# Altium footprint library 6-Connectors-5.PcbLib: 46 footprints (part 3 of 5) (continued)
## HARTING_09 25 130 6921 [mm] "DIN 41612, Type 3C, Thru-Hole;  Rows a+b+c, 30 Positions, Performance level 2, Lead 3.0mm, Pitch 2.54mm, Right Angle Male Connector"
height 11
pads (32):
  round 1.7 hole 1: a1(0,0) a2(0,-2.54) a3(0,-5.08) a4(0,-7.62) a5(0,-10.16) a6(0,-12.7) a7(0,-15.24) a8(0,-17.78) a9(0,-20.32) a10(0,-22.86) b1(-2.54,0) b2(-2.54,-2.54) b3(-2.54,-5.08) b4(-2.54,-7.62) b5(-2.54,-10.16) b6(-2.54,-12.7) b7(-2.54,-15.24) b8(-2.54,-17.78) b9(-2.54,-20.32) b10(-2.54,-22.86) c1(-5.08,0) c2(-5.08,-2.54) c3(-5.08,-5.08) c4(-5.08,-7.62) c5(-5.08,-10.16) c6(-5.08,-12.7) c7(-5.08,-15.24) c8(-5.08,-17.78) c9(-5.08,-20.32) c10(-5.08,-22.86)
  round 3.5 / inner round 3.5 / far side round 5.1 hole 2.8: MTG1(2.54,5.08) MTG2(2.54,-27.94)
Top Overlay:
  lines w0.2: 2.04,-24.93 -0.31,-24.93 -0.31,-30.78 7.74,-30.78 7.74,-27.28 ; 2.04,2.07 -0.31,2.07 -0.31,7.92 7.74,7.92 7.74,4.32 ; 2.04,-25.14 3.897,-25.14 5.132,-27.28 12.64,-27.28 12.64,4.32 5.132,4.32 3.897,2.18 2.04,2.18 2.04,-25.14
  text "10" at -8.327,-23.435 h1.2
  text "5" at -7.304,-10.76 h1.2
  text "1" at -6.919,-0.725 h1.2
  text "b" at -2.94,1.48 h1.2
  text "c" at -5.465,1.48 h1.2
  text "a" at 2.785,-0.395 h1.2
Mechanical 8:
  lines w0.1: -5.58,-22.86 -5.08,-22.86 ; -5.08,-23.36 -5.08,-22.86 ; -5.08,-22.36 -5.08,-22.86 ; -4.58,-22.86 -5.08,-22.86 ; -3.04,-22.86 -2.54,-22.86 ; -2.54,-23.36 -2.54,-22.86 ; -2.54,-22.36 -2.54,-22.86 ; -2.04,-22.86 -2.54,-22.86 ; -0.5,-22.86 0,-22.86 ; -0.5,0 0,0 ; 0,-23.36 0,-22.86 ; 0,-22.36 0,-22.86 ; 0,-0.5 0,0 ; 0,0.5 0,0 ; 0.5,-22.86 0,-22.86 ; 0.5,0 0,0 ; 2.04,-27.94 2.54,-27.94 ; 2.04,5.08 2.54,5.08 ; 2.54,-28.44 2.54,-27.94 ; 2.54,-27.44 2.54,-27.94 ; 2.54,4.58 2.54,5.08 ; 2.54,5.58 2.54,5.08 ; 3.04,-27.94 2.54,-27.94 ; 3.04,5.08 2.54,5.08 ; -5.08,0 -5.58,0 -5.08,0 ; -5.08,0 -5.08,0.5 -5.08,0 ; -5.08,0 -4.58,0 -5.08,0 ; -5.08,0 -5.08,-0.5 -5.08,0 ; -2.54,0 -3.04,0 -2.54,0 ; -2.54,0 -2.54,0.5 -2.54,0 ; -2.54,0 -2.04,0 -2.54,0 ; -2.54,0 -2.54,-0.5 -2.54,0
Mechanical 14:
  lines w0.1: 2.04,-24.93 -0.31,-24.93 -0.31,-30.78 7.74,-30.78 7.74,-27.28 ; 2.04,-23.16 -5.08,-23.16 cw(c-5.08,-22.86) -5.08,-22.56 2.04,-22.562 ; 2.04,-20.62 -5.08,-20.62 cw(c-5.08,-20.32) -5.08,-20.02 2.04,-20.022 ; 2.04,-18.08 -5.08,-18.08 cw(c-5.08,-17.78) -5.08,-17.48 2.04,-17.482 ; 2.04,-15.54 -5.08,-15.54 cw(c-5.08,-15.24) -5.08,-14.94 2.04,-14.942 ; 2.04,-13 -5.08,-13 cw(c-5.08,-12.7) -5.08,-12.4 2.04,-12.402 ; 2.04,-10.46 -5.08,-10.46 cw(c-5.08,-10.16) -5.08,-9.86 2.04,-9.862 ; 2.04,-7.92 -5.08,-7.92 cw(c-5.08,-7.62) -5.08,-7.32 2.04,-7.322 ; 2.04,-5.38 -5.08,-5.38 cw(c-5.08,-5.08) -5.08,-4.78 2.04,-4.782 ; 2.04,-2.84 -5.08,-2.84 cw(c-5.08,-2.54) -5.08,-2.24 2.04,-2.242 ; 2.04,-0.3 -5.08,-0.3 cw(c-5.08,0) -5.08,0.3 2.04,0.298 ; 2.04,2.07 -0.31,2.07 -0.31,7.92 7.74,7.92 7.74,4.32 ; 2.04,-25.14 3.897,-25.14 5.132,-27.28 12.64,-27.28 12.64,4.32 5.132,4.32 3.897,2.18 2.04,2.18 2.04,-25.14
  text "10" at -8.327,-23.435 h1.2
  text "1" at -6.919,-0.725 h1.2
  text "5" at -7.304,-10.76 h1.2
  text "b" at -2.94,1.48 h1.2
  text "c" at -5.465,1.48 h1.2
3D body "v160-080.stp": height 0.02, standoff -1.65, extent -0.8,-23.66 0.8,-22.06
3D body "v160-080.stp": height 0.02, standoff -1.65, extent -3.34,-23.66 -1.74,-22.06
3D body "v160-080.stp": height 0.02, standoff -1.65, extent -5.88,-23.66 -4.28,-22.06
3D body "v160-080.stp": height 0.02, standoff -1.65, extent -0.8,-21.12 0.8,-19.52
3D body "v160-080.stp": height 0.02, standoff -1.65, extent -3.34,-21.12 -1.74,-19.52
3D body "v160-080.stp": height 0.02, standoff -1.65, extent -5.88,-21.12 -4.28,-19.52
3D body "v160-080.stp": height 0.02, standoff -1.65, extent -0.8,-18.58 0.8,-16.98
3D body "v160-080.stp": height 0.02, standoff -1.65, extent -3.34,-18.58 -1.74,-16.98
3D body "v160-080.stp": height 0.02, standoff -1.65, extent -5.88,-18.58 -4.28,-16.98
3D body "v160-080.stp": height 0.02, standoff -1.65, extent -0.8,-16.04 0.8,-14.44
3D body "v160-080.stp": height 0.02, standoff -1.65, extent -3.34,-16.04 -1.74,-14.44
3D body "v160-080.stp": height 0.02, standoff -1.65, extent -5.88,-16.04 -4.28,-14.44
3D body "v160-080.stp": height 0.02, standoff -1.65, extent -0.8,-13.5 0.8,-11.9
3D body "v160-080.stp": height 0.02, standoff -1.65, extent -3.34,-13.5 -1.74,-11.9
3D body "v160-080.stp": height 0.02, standoff -1.65, extent -5.88,-13.5 -4.28,-11.9
3D body "v160-080.stp": height 0.02, standoff -1.65, extent -0.8,-10.96 0.8,-9.36
3D body "v160-080.stp": height 0.02, standoff -1.65, extent -3.34,-10.96 -1.74,-9.36
3D body "v160-080.stp": height 0.02, standoff -1.65, extent -5.88,-10.96 -4.28,-9.36
3D body "v160-080.stp": height 0.02, standoff -1.65, extent -0.8,-8.42 0.8,-6.82
3D body "v160-080.stp": height 0.02, standoff -1.65, extent -3.34,-8.42 -1.74,-6.82
3D body "v160-080.stp": height 0.02, standoff -1.65, extent -5.88,-8.42 -4.28,-6.82
3D body "v160-080.stp": height 0.02, standoff -1.65, extent -0.8,-5.88 0.8,-4.28
3D body "v160-080.stp": height 0.02, standoff -1.65, extent -3.34,-5.88 -1.74,-4.28
3D body "v160-080.stp": height 0.02, standoff -1.65, extent -5.88,-5.88 -4.28,-4.28
3D body "v160-080.stp": height 0.02, standoff -1.65, extent -0.8,-3.34 0.8,-1.74
3D body "v160-080.stp": height 0.02, standoff -1.65, extent -3.34,-3.34 -1.74,-1.74
3D body "v160-080.stp": height 0.02, standoff -1.65, extent -5.88,-3.34 -4.28,-1.74
3D body "v160-080.stp": height 0.02, standoff -1.65, extent -0.8,-0.8 0.8,0.8
3D body "v160-080.stp": height 0.02, standoff -1.65, extent -3.34,-0.8 -1.74,0.8
3D body "v160-080.stp": height 0.02, standoff -1.65, extent -5.88,-0.8 -4.28,0.8
3D body "HARTING_09 25 130 6921.stp": height 9.35, standoff -3, extent -5.38,-30.78 12.64,7.92

## HARTING_09 73 296 6801 [mm] "Connector; DIN 41612, Type R, Thru-Hole; Rows a+b+c, 96 Position; Right Angle"
height 9.5
pads (98):
  round 1.7 hole 1: a1(0,0) a2(0,-2.54) a3(0,-5.08) a4(0,-7.62) a5(0,-10.16) a6(0,-12.7) a7(0,-15.24) a8(0,-17.78) a9(0,-20.32) a10(0,-22.86) a11(0,-25.4) a12(0,-27.94) a13(0,-30.48) a14(0,-33.02) a15(0,-35.56) a16(0,-38.1) a17(0,-40.64) a18(0,-43.18) a19(0,-45.72) a20(0,-48.26) a21(0,-50.8) a22(0,-53.34) a23(0,-55.88) a24(0,-58.42) a25(0,-60.96) a26(0,-63.5) a27(0,-66.04) a28(0,-68.58) a29(0,-71.12) a30(0,-73.66) a31(0,-76.2) a32(0,-78.74) b1(-2.54,0) b2(-2.54,-2.54) b3(-2.54,-5.08) b4(-2.54,-7.62) b5(-2.54,-10.16) b6(-2.54,-12.7) b7(-2.54,-15.24) b8(-2.54,-17.78) b9(-2.54,-20.32) b10(-2.54,-22.86) b11(-2.54,-25.4) b12(-2.54,-27.94) b13(-2.54,-30.48) b14(-2.54,-33.02) b15(-2.54,-35.56) b16(-2.54,-38.1) b17(-2.54,-40.64) b18(-2.54,-43.18) b19(-2.54,-45.72) b20(-2.54,-48.26) b21(-2.54,-50.8) b22(-2.54,-53.34) b23(-2.54,-55.88) b24(-2.54,-58.42) b25(-2.54,-60.96) b26(-2.54,-63.5) b27(-2.54,-66.04) b28(-2.54,-68.58) b29(-2.54,-71.12) b30(-2.54,-73.66) b31(-2.54,-76.2) b32(-2.54,-78.74) c1(-5.08,0) c2(-5.08,-2.54) c3(-5.08,-5.08) c4(-5.08,-7.62) c5(-5.08,-10.16) c6(-5.08,-12.7) c7(-5.08,-15.24) c8(-5.08,-17.78) c9(-5.08,-20.32) c10(-5.08,-22.86) c11(-5.08,-25.4) c12(-5.08,-27.94) c13(-5.08,-30.48) c14(-5.08,-33.02) c15(-5.08,-35.56) c16(-5.08,-38.1) c17(-5.08,-40.64) c18(-5.08,-43.18) c19(-5.08,-45.72) c20(-5.08,-48.26) c21(-5.08,-50.8) c22(-5.08,-53.34) c23(-5.08,-55.88) c24(-5.08,-58.42) c25(-5.08,-60.96) c26(-5.08,-63.5) c27(-5.08,-66.04) c28(-5.08,-68.58) c29(-5.08,-71.12) c30(-5.08,-73.66) c31(-5.08,-76.2) c32(-5.08,-78.74)
  round 3.5 / inner round 3.5 / far side round 5.1 hole 2.8: MTG1(2.54,5.08) MTG2(2.54,-83.82)
Top Overlay:
  lines w0.2: 1.738,-86.32 0.01,-86.32 0.01,-81.395 1.14,-81.395 1.14,2.655 0.01,2.655 0.01,7.58 1.738,7.58 ; 3.556,-86.32 6.14,-86.32 6.14,-84.003 6.14,5.263 6.14,7.58 3.556,7.58 ; 6.14,-81.845 12.06,-81.845 ; 6.14,-80.795 6.77,-80.795 12.06,-80.795 ; 6.14,2.055 6.77,2.055 12.06,2.055 ; 6.14,3.105 12.06,3.105 ; 12.06,-81.845 12.06,-80.795 ; 12.06,-81.845 12.69,-81.215 12.69,-80.165 ; 12.06,-80.795 12.06,2.055 ; 12.06,-80.795 12.69,-80.165 ; 12.06,2.055 12.06,3.105 ; 12.06,2.055 12.69,1.425 ; 12.06,3.105 12.69,2.475 12.69,1.425 ; 12.69,-80.165 12.69,1.425
  text "5" at -6.895,-10.785 h1.2
  text "1" at -6.695,-0.725 h1.2
  text "30" at -8.12,-74.235 h1.2
  text "10" at -8.02,-23.535 h1.2
  text "32" at -8.12,-79.315 h1.2
  text "25" at -8.1,-61.6 h1.2
  text "c" at -4.58,2.04 h1.2
  text "b" at -2.04,2.04 h1.2
  text "a" at -0.6,2.04 h1.2
  text "15" at -8.02,-36.235 h1.2
  text "20" at -8.12,-48.835 h1.2
Mechanical 8:
  lines w0.1: -5.08,-39.37 12.64,-39.37 ; 5.3,-86.3 5.3,7.5
Mechanical 14:
  circle w0.1: c2.54,5.08 r1.4
  circle w0.1: c2.54,-83.82 r1.4
  lines w0.1: 1.14,-77.97 5.59,-77.97 ; 1.14,-76.97 5.59,-76.97 ; 1.14,-52.57 5.59,-52.57 ; 1.14,-51.57 5.59,-51.57 ; 1.14,-27.17 5.59,-27.17 ; 1.14,-26.17 5.59,-26.17 ; 1.14,-1.77 5.59,-1.77 ; 1.14,-0.77 5.59,-0.77 ; 1.297,5.08 2.54,5.08 ; 6.14,-81.845 12.06,-81.845 ; 6.14,-80.795 6.77,-80.795 ; 6.14,2.055 6.77,2.055 ; 6.14,3.105 12.06,3.105 ; 1.14,-81.395 0.01,-81.395 0.01,-86.32 6.14,-86.32 6.14,-84.003 ; 1.14,-81.395 4.084,-81.395 5.59,-84.003 ; 1.14,-81.395 1.14,2.655 ; 1.14,2.655 0.01,2.655 0.01,7.58 6.14,7.58 6.14,5.263 ; 1.14,2.655 4.084,2.655 5.59,5.263 ; 5.59,-84.003 6.14,-84.003 ; 5.59,-84.003 5.59,-77.72 1.69,-77.72 1.69,-77.22 5.59,-77.22 5.59,-52.32 1.69,-52.32 1.69,-51.82 5.59,-51.82 5.59,-26.92 1.69,-26.92 1.69,-26.42 5.59,-26.42 5.59,-1.52 1.69,-1.52 1.69,-1.02 5.59,-1.02 5.59,5.263 ; 5.59,5.263 6.14,5.263 ; 6.14,-84.003 6.14,5.263 ; 6.77,-80.795 6.77,2.055 ; 6.77,-80.795 12.06,-80.795 ; 6.77,2.055 12.06,2.055 ; 12.06,-81.845 12.06,-80.795 ; 12.06,-81.845 12.69,-81.215 12.69,-80.165 ; 12.06,-80.795 12.06,2.055 ; 12.06,-80.795 12.69,-80.165 ; 12.06,2.055 12.06,3.105 ; 12.06,2.055 12.69,1.425 ; 12.06,3.105 12.69,2.475 12.69,1.425 ; 12.69,-80.165 12.69,1.425
  text "5" at -6.895,-10.785 h1.2
  text "10" at -8.02,-23.535 h1.2
  text "25" at -8.1,-61.6 h1.2
  text "1" at -6.695,-0.725 h1.2
  text "32" at -8.12,-79.315 h1.2
  text "15" at -8.02,-36.235 h1.2
  text "20" at -8.12,-48.835 h1.2
  text "30" at -8.12,-74.235 h1.2
  text "c" at -4.58,2.04 h1.2
  text "b" at -2.04,2.04 h1.2
  text "a" at -0.6,2.04 h1.2
3D body "HARTING_09 73 296 6801.stp": height 9.1, standoff -3, extent -5.38,-86.37 12.74,7.63

## HARTING_09 79 196 6903 [mm] "DIN 41612, Type RL, 96 Position, Rows a+b+c, Performance level 2, Straight Male Connector, Lead 4.0 mm, Pitch 2.54mm"
height 11.6
pads (98):
  round 1.7 hole 1: a1(0,0) a2(0,-2.54) a3(0,-5.08) a4(0,-7.62) a5(0,-10.16) a6(0,-12.7) a7(0,-15.24) a8(0,-17.78) a9(0,-20.32) a10(0,-22.86) a11(0,-25.4) a12(0,-27.94) a13(0,-30.48) a14(0,-33.02) a15(0,-35.56) a16(0,-38.1) a17(0,-40.64) a18(0,-43.18) a19(0,-45.72) a20(0,-48.26) a21(0,-50.8) a22(0,-53.34) a23(0,-55.88) a24(0,-58.42) a25(0,-60.96) a26(0,-63.5) a27(0,-66.04) a28(0,-68.58) a29(0,-71.12) a30(0,-73.66) a31(0,-76.2) a32(0,-78.74) b1(2.54,0) b2(2.54,-2.54) b3(2.54,-5.08) b4(2.54,-7.62) b5(2.54,-10.16) b6(2.54,-12.7) b7(2.54,-15.24) b8(2.54,-17.78) b9(2.54,-20.32) b10(2.54,-22.86) b11(2.54,-25.4) b12(2.54,-27.94) b13(2.54,-30.48) b14(2.54,-33.02) b15(2.54,-35.56) b16(2.54,-38.1) b17(2.54,-40.64) b18(2.54,-43.18) b19(2.54,-45.72) b20(2.54,-48.26) b21(2.54,-50.8) b22(2.54,-53.34) b23(2.54,-55.88) b24(2.54,-58.42) b25(2.54,-60.96) b26(2.54,-63.5) b27(2.54,-66.04) b28(2.54,-68.58) b29(2.54,-71.12) b30(2.54,-73.66) b31(2.54,-76.2) b32(2.54,-78.74) c1(5.08,0) c2(5.08,-2.54) c3(5.08,-5.08) c4(5.08,-7.62) c5(5.08,-10.16) c6(5.08,-12.7) c7(5.08,-15.24) c8(5.08,-17.78) c9(5.08,-20.32) c10(5.08,-22.86) c11(5.08,-25.4) c12(5.08,-27.94) c13(5.08,-30.48) c14(5.08,-33.02) c15(5.08,-35.56) c16(5.08,-38.1) c17(5.08,-40.64) c18(5.08,-43.18) c19(5.08,-45.72) c20(5.08,-48.26) c21(5.08,-50.8) c22(5.08,-53.34) c23(5.08,-55.88) c24(5.08,-58.42) c25(5.08,-60.96) c26(5.08,-63.5) c27(5.08,-66.04) c28(5.08,-68.58) c29(5.08,-71.12) c30(5.08,-73.66) c31(5.08,-76.2) c32(5.08,-78.74)
  round 3.5 / inner round 3.5 / far side round 5.1 hole 2.8: MTG1(1.81,5.63) MTG2(1.81,-84.37)
Top Overlay:
  lines w0.2: -1.835,-83.32 -1.835,-86.87 0.152,-86.87 ; -1.835,4.58 -1.835,8.13 0.152,8.13 ; -1.36,-79.484 -1.36,-81.47 ; -1.36,0.744 -1.36,2.83 ; -1,-83.32 -3.01,-83.32 -3.01,4.58 -1,4.58 ; -0.89,-86.87 -0.89,-85.678 ; -0.89,-83.062 -0.89,-81.92 ; -0.89,-82.57 -2.46,-82.57 ; -0.89,3.28 -0.89,4.322 ; -0.89,3.93 -2.46,3.93 ; -0.89,6.938 -0.89,8.13 ; -0.055,3.28 -1.81,3.28 -1.81,-81.92 0.079,-81.92 ; 0.733,2.83 -1.36,2.83 ; 1.042,-81.47 -1.36,-81.47 ; 2.578,-81.47 4.06,-81.47 ; 2.887,2.83 4.06,2.83 ; 3.468,-86.87 6.915,-86.87 6.915,-83.32 ; 3.468,8.13 6.915,8.13 6.915,4.58 ; 3.541,-81.92 4.51,-81.92 4.06,-81.47 ; 3.675,3.28 4.51,3.28 4.06,2.83 ; 4.51,-86.87 4.51,-85.678 ; 4.51,-83.062 4.51,-80.97 ; 4.51,-81.62 7.54,-81.62 ; 4.51,2.98 7.54,2.98 ; 4.51,4.322 4.51,2.33 ; 4.51,6.938 4.51,8.13 ; 4.62,-83.32 8.09,-83.32 8.09,4.58 4.62,4.58 ; 6.44,-79.484 6.44,-80.52 ; 6.44,0.744 6.44,1.88 ; -2.46,-82.57 -2.46,3.93 ; -2.46,-82.57 -1.36,-81.47 ; -2.46,3.93 -1.36,2.83 ; 4.06,-81.47 4.06,-80.52 ; 4.06,-80.52 6.44,-80.52 ; 4.06,-80.52 4.51,-80.97 ; 4.06,1.88 4.06,2.83 ; 4.06,1.88 6.44,1.88 ; 4.06,1.88 4.51,2.33 ; 4.51,-80.97 6.89,-80.97 6.89,2.33 4.51,2.33 ; 6.44,-80.52 7.54,-81.62 ; 6.44,1.88 7.54,2.98 ; 7.54,-81.62 7.54,2.98
  text "1" at -4.127,-0.6 h1.2
  text "5" at -4.763,-10.76 h1.2
  text "a" at -0.318,1.587 h1.2
  text "b" at 1.27,1.587 h1.2
  text "c" at 2.857,1.587 h1.2
  text "10" at -5.715,-23.46 h1.2
  text "15" at -5.715,-36.16 h1.2
  text "20" at -5.715,-48.86 h1.2
  text "25" at -5.715,-61.56 h1.2
  text "30" at -5.715,-74.26 h1.2
  text "32" at -5.715,-79.34 h1.2
Mechanical 8:
  drawing of 400 lines, arcs and shapes, not listed
Mechanical 14:
  circle w0.1: c1.81,5.63 r1.4
  circle w0.1: c1.81,-84.37 r1.4
  lines w0.1: -1.835,-83.32 -1.835,-86.87 6.915,-86.87 6.915,-83.32 ; -1.835,4.58 -1.835,8.13 6.915,8.13 6.915,4.58 ; -0.89,-86.87 -0.89,-81.92 ; -0.89,-83.32 -3.01,-83.32 -3.01,4.58 -0.89,4.58 ; -0.89,-82.82 0.288,-82.82 cw(c1.81,-84.74) 3.332,-82.82 4.51,-82.82 ; -0.89,-82.57 -2.46,-82.57 ; -0.89,3.28 -0.89,8.13 ; -0.89,3.93 -2.46,3.93 ; -0.89,4.08 0.288,4.08 ccw(c1.81,6) 3.332,4.08 4.51,4.08 ; 4.51,-86.87 4.51,-80.97 ; 4.51,-83.32 8.09,-83.32 8.09,4.58 4.51,4.58 ; 4.51,-81.62 7.54,-81.62 ; 4.51,2.98 7.54,2.98 ; 4.51,8.13 4.51,2.33 ; -2.46,-82.57 -2.46,3.93 ; -2.46,-82.57 -1.36,-81.47 ; -2.46,3.93 -1.36,2.83 ; -1.36,-81.47 4.06,-81.47 ; -1.36,-81.47 -1.36,2.83 ; -1.36,2.83 4.06,2.83 ; 4.06,-81.47 4.06,-80.52 ; 4.06,-81.47 4.51,-81.92 -1.81,-81.92 -1.81,3.28 4.51,3.28 4.06,2.83 ; 4.06,-80.52 6.44,-80.52 ; 4.06,-80.52 4.51,-80.97 ; 4.06,1.88 4.06,2.83 ; 4.06,1.88 6.44,1.88 ; 4.06,1.88 4.51,2.33 ; 4.51,-80.97 6.89,-80.97 6.89,2.33 4.51,2.33 ; 6.44,-80.52 6.44,1.88 ; 6.44,-80.52 7.54,-81.62 ; 6.44,1.88 7.54,2.98 ; 7.54,-81.62 7.54,2.98
  text "32" at -5.715,-79.34 h1.2
  text "30" at -5.715,-74.26 h1.2
  text "25" at -5.715,-61.56 h1.2
  text "20" at -5.715,-48.86 h1.2
  text "15" at -5.715,-36.16 h1.2
  text "10" at -5.715,-23.46 h1.2
  text "c" at 2.857,1.587 h1.2
  text "b" at 1.27,1.587 h1.2
  text "a" at -0.318,1.587 h1.2
  text "5" at -4.763,-10.76 h1.2
  text "1" at -4.127,-0.6 h1.2
3D body "HARTING_09 79 196 6903.stp": height 11.6, standoff -2.5, extent -3.01,-86.87 8.09,8.13

## HARTING_60 01 068 5232 [mm] "68 Positions, Pitch 1.27mm, Right Angle HAR-MIK Male Connector, Panel Fixing M2.5 / PCB Fixing M2.5"
height 9.5
pads (70):
  round 1.5 hole 0.8: 1(-20.955,3.81) 2(-19.685,1.905) 3(-18.415,3.81) 4(-17.145,1.905) 5(-15.875,3.81) 6(-14.605,1.905) 7(-13.335,3.81) 8(-12.065,1.905) 9(-10.795,3.81) 10(-9.525,1.905) 11(-8.255,3.81) 12(-6.985,1.905) 13(-5.715,3.81) 14(-4.445,1.905) 15(-3.175,3.81) 16(-1.905,1.905) 17(-0.635,3.81) 18(0.635,1.905) 19(1.905,3.81) 20(3.175,1.905) 21(4.445,3.81) 22(5.715,1.905) 23(6.985,3.81) 24(8.255,1.905) 25(9.525,3.81) 26(10.795,1.905) 27(12.065,3.81) 28(13.335,1.905) 29(14.605,3.81) 30(15.875,1.905) 31(17.145,3.81) 32(18.415,1.905) 33(19.685,3.81) 34(20.955,1.905) 35(-20.955,0) 36(-19.685,-1.905) 37(-18.415,0) 38(-17.145,-1.905) 39(-15.875,0) 40(-14.605,-1.905) 41(-13.335,0) 42(-12.065,-1.905) 43(-10.795,0) 44(-9.525,-1.905) 45(-8.255,0) 46(-6.985,-1.905) 47(-5.715,0) 48(-4.445,-1.905) 49(-3.175,0) 50(-1.905,-1.905) 51(-0.635,0) 52(0.635,-1.905) 53(1.905,0) 54(3.175,-1.905) 55(4.445,0) 56(5.715,-1.905) 57(6.985,0) 58(8.255,-1.905) 59(9.525,0) 60(10.795,-1.905) 61(12.065,0) 62(13.335,-1.905) 63(14.605,0) 64(15.875,-1.905) 65(17.145,0) 66(18.415,-1.905) 67(19.685,0) 68(20.955,-1.905)
  round 5 hole 2.8: 69(-28.94,0) 70(28.94,0)
Top Overlay:
  lines w0.2: -31.94,-5.904 -19.941,-5.904 -19.941,-6.604 ; -31.94,-3.805 -26.515,-3.805 -26.515,-1.6 ; -26.506,1.65 -26.506,5.194 ; -26.116,-6.604 -26.115,-10.504 -26.915,-10.504 -26.915,-10.804 -26.04,-12.104 26.04,-12.104 26.915,-10.804 26.915,-10.504 26.115,-10.504 26.115,-6.604 ; -25.116,5.194 -24.716,-3.005 24.715,-3.005 25.115,5.194 ; -19.841,-3.005 -19.841,-3.805 -9.317,-3.805 -9.317,-3.005 ; -9.217,-6.604 -9.217,-5.904 9.217,-5.904 9.217,-6.604 ; 9.317,-3.005 9.317,-3.805 19.841,-3.805 19.841,-3.005 ; 19.941,-6.604 19.941,-5.904 31.94,-5.904 ; 26.515,-1.6 26.515,-3.805 31.94,-3.805 ; 26.525,1.65 26.525,5.194 ; -31.94,-6.604 31.94,-6.604 31.94,5.194 -31.94,5.194 -31.94,-6.604
  text "35" at -23.875,-0.523 h1
  text "2" at -23.45,1.477 h1
  text "1" at -23.3,3.35 h1
  text "36" at -23.825,-2.35 h1
  text "33" at 22.1,3.4 h1
  text "68" at 22.15,-2.425 h1
  text "67" at 22.125,-0.425 h1
  text "34" at 22.15,1.425 h1
Mechanical 8:
  drawing of 280 lines, arcs and shapes, not listed
Mechanical 14:
  circle w0.1: c28.94,0 r1.006
  circle w0.1: c-28.94,0 r1.006
  lines w0.1: -31.94,-5.904 -19.941,-5.904 -19.941,-6.604 ; -31.94,-3.805 -26.515,-3.805 -26.515,5.194 ; -26.116,-6.604 -26.115,-10.504 -26.915,-10.504 -26.915,-10.804 -26.04,-12.104 26.04,-12.104 26.915,-10.804 26.915,-10.504 26.115,-10.504 26.115,-6.604 ; -25.116,5.194 -24.716,-3.005 24.715,-3.005 25.115,5.194 ; -21.156,-3.005 -21.156,4.12 -20.756,4.12 -20.756,-3.005 ; -19.886,-3.005 -19.886,2.22 -19.486,2.22 -19.486,-3.005 ; -19.841,-3.005 -19.841,-3.805 -9.317,-3.805 -9.317,-3.005 ; -18.616,-3.005 -18.616,4.12 -18.216,4.12 -18.216,-3.005 ; -17.346,-3.005 -17.346,2.22 -16.946,2.22 -16.946,-3.005 ; -16.076,-3.005 -16.076,4.12 -15.676,4.12 -15.676,-3.005 ; -14.807,-3.005 -14.807,2.22 -14.407,2.22 -14.407,-3.005 ; -13.537,-3.005 -13.537,4.12 -13.137,4.12 -13.137,-3.005 ; -12.267,-3.005 -12.267,2.22 -11.867,2.22 -11.867,-3.005 ; -10.997,-3.005 -10.997,4.12 -10.597,4.12 -10.597,-3.005 ; -9.727,-3.005 -9.727,2.22 -9.327,2.22 -9.327,-3.005 ; -9.217,-6.604 -9.217,-5.904 9.217,-5.904 9.217,-6.604 ; -8.457,-3.005 -8.457,4.12 -8.057,4.12 -8.057,-3.005 ; -7.187,-3.005 -7.187,2.22 -6.787,2.22 -6.787,-3.005 ; -5.917,-3.005 -5.917,4.12 -5.517,4.12 -5.517,-3.005 ; -4.647,-3.005 -4.647,2.22 -4.247,2.22 -4.247,-3.005 ; -3.378,-3.005 -3.378,4.12 -2.978,4.12 -2.978,-3.005 ; -2.108,-3.005 -2.108,2.22 -1.708,2.22 -1.708,-3.005 ; -0.838,-3.005 -0.838,4.12 -0.438,4.12 -0.438,-3.005 ; 0.432,-3.005 0.432,2.22 0.832,2.22 0.832,-3.005 ; 1.702,-3.005 1.702,4.12 2.102,4.12 2.102,-3.005 ; 2.972,-3.005 2.972,2.22 3.372,2.22 3.372,-3.005 ; 4.242,-3.005 4.242,4.12 4.642,4.12 4.642,-3.005 ; 5.512,-3.005 5.512,2.22 5.911,2.22 5.911,-3.005 ; 6.781,-3.005 6.781,4.12 7.181,4.12 7.181,-3.005 ; 8.051,-3.005 8.051,2.22 8.451,2.22 8.451,-3.005 ; 9.317,-3.005 9.317,-3.805 19.841,-3.805 19.841,-3.005 ; 9.321,-3.005 9.321,4.12 9.721,4.12 9.721,-3.005 ; 10.591,-3.005 10.591,2.22 10.991,2.22 10.991,-3.005 ; 11.861,-3.005 11.861,4.12 12.261,4.12 12.261,-3.005 ; 13.131,-3.005 13.131,2.22 13.531,2.22 13.531,-3.005 ; 14.401,-3.005 14.401,4.12 14.801,4.12 14.801,-3.005 ; 15.671,-3.005 15.671,2.22 16.071,2.22 16.071,-3.005 ; 16.941,-3.005 16.941,4.12 17.34,4.12 17.34,-3.005 ; 18.21,-3.005 18.21,2.22 18.61,2.22 18.61,-3.005 ; 19.48,-3.005 19.48,4.12 19.88,4.12 19.88,-3.005 ; 19.941,-6.604 19.941,-5.904 31.94,-5.904 ; 20.75,-3.005 20.75,2.22 21.15,2.22 21.15,-3.005 ; 26.515,5.194 26.515,-3.805 31.94,-3.805 ; -31.94,-6.604 31.94,-6.604 31.94,5.194 -31.94,5.194 -31.94,-6.604
  text "35" at -23.45,-0.523 h1.02
  text "2" at -23.45,1.477 h1.02
  text "1" at -23.45,3.327 h1.02
  text "36" at -23.45,-2.273 h1.02
  text "34" at 22.15,1.425 h1
  text "67" at 22.125,-0.425 h1
  text "68" at 22.15,-2.425 h1
  text "33" at 22.1,3.4 h1
3D body "HARTING_60 01 068 5232.stp": height 9.5, standoff -3.4, extent -31.94,-12.105 31.94,5.195

## HIROSE_FX2-40P-1.27DSL(71) [mm] "40 Contacts, 1.27mm Pitch, Right Angle Board to Board & Mezzanine Header with Prefixed Pin"
height 7.5
pads (42):
  round 1.5 hole 0.8: a1(-12.065,-0.953) a2(-10.795,-2.858) a3(-9.525,-0.953) a4(-8.255,-2.858) a5(-6.985,-0.953) a6(-5.715,-2.858) a7(-4.445,-0.953) a8(-3.175,-2.858) a9(-1.905,-0.953) a10(-0.635,-2.858) a11(0.635,-0.953) a12(1.905,-2.858) a13(3.175,-0.953) a14(4.445,-2.858) a15(5.715,-0.953) a16(6.985,-2.858) a17(8.255,-0.953) a18(9.525,-2.858) a19(10.795,-0.953) a20(12.065,-2.858) b1(-12.065,2.858) b2(-10.795,0.953) b3(-9.525,2.858) b4(-8.255,0.953) b5(-6.985,2.858) b6(-5.715,0.953) b7(-4.445,2.858) b8(-3.175,0.953) b9(-1.905,2.858) b10(-0.635,0.953) b11(0.635,2.858) b12(1.905,0.953) b13(3.175,2.858) b14(4.445,0.953) b15(5.715,2.858) b16(6.985,0.953) b17(8.255,2.858) b18(9.525,0.953) b19(10.795,2.858) b20(12.065,0.953)
  round 3 hole 2.3: MECH1(-15.375,0.953) MECH2(15.375,0.953)
Top Overlay:
  circle w0.3: c-12.1,-4.3 r0.15
  lines w0.2: -17.725,-0.243 -17.375,-0.243 -15.375,-1.398 -13.375,-0.243 -13.025,-0.243 ; -17.725,2.148 -17.375,2.148 -15.375,3.303 -13.375,2.148 -13.025,2.148 ; -13.025,-3.643 -13.025,-1.586 ; -13.025,-0.319 -13.025,2.224 ; -11.635,-3.643 -17.725,-3.643 -17.725,11.358 17.725,11.358 17.725,-3.643 12.905,-3.643 ; 11.944,3.858 13.025,3.858 13.025,1.586 ; 13.025,-3.643 13.025,-3.491 ; 13.025,-2.224 13.025,0.319 ; 13.025,-0.243 13.375,-0.243 15.375,-1.398 17.375,-0.243 17.725,-0.243 ; 13.025,2.148 13.375,2.148 15.375,3.303 17.375,2.148 17.725,2.148 ; -17.725,3.558 -12.977,3.558 -17.725,3.558 ; 13.025,3.558 17.725,3.558 13.025,3.558
  text "a1" at -14.787,-2.66 h1
  text "a20" at 13.588,-3.085 h1
  text "b1" at -12.647,4.742 h1
  text "b19" at 10.213,4.742 h1
Mechanical 8:
  drawing of 172 lines, arcs and shapes, not listed
Mechanical 14:
  circle w0.3: c-13.6,-1.1 r0.15
  lines w0.1: -17.725,-0.243 -17.375,-0.243 -15.375,-1.398 -13.375,-0.243 -13.025,-0.243 ; -17.725,2.148 -17.375,2.148 -15.375,3.303 -13.375,2.148 -13.025,2.148 ; -13.025,-3.643 -13.025,3.858 13.025,3.858 13.025,-3.643 ; -12.34,3.858 -12.34,-1.102 -11.79,-1.102 -11.79,3.858 ; -11.07,3.858 -11.07,-3.008 -10.52,-3.008 -10.52,3.858 ; -9.8,3.858 -9.8,-1.102 -9.25,-1.102 -9.25,3.858 ; -8.53,3.858 -8.53,-3.008 -7.98,-3.008 -7.98,3.858 ; -7.26,3.858 -7.26,-1.102 -6.71,-1.102 -6.71,3.858 ; -5.99,3.858 -5.99,-3.008 -5.44,-3.008 -5.44,3.858 ; -4.72,3.858 -4.72,-1.102 -4.17,-1.102 -4.17,3.858 ; -3.45,3.858 -3.45,-3.008 -2.9,-3.008 -2.9,3.858 ; -2.18,3.858 -2.18,-1.102 -1.63,-1.102 -1.63,3.858 ; -0.91,3.858 -0.91,-3.008 -0.36,-3.008 -0.36,3.858 ; 0.36,3.858 0.36,-1.102 0.91,-1.102 0.91,3.858 ; 1.63,3.858 1.63,-3.008 2.18,-3.008 2.18,3.858 ; 2.9,3.858 2.9,-1.102 3.45,-1.102 3.45,3.858 ; 4.17,3.858 4.17,-3.008 4.72,-3.008 4.72,3.858 ; 5.44,3.858 5.44,-1.102 5.99,-1.102 5.99,3.858 ; 6.71,3.858 6.71,-3.008 7.26,-3.008 7.26,3.858 ; 7.98,3.858 7.98,-1.102 8.53,-1.102 8.53,3.858 ; 9.25,3.858 9.25,-3.008 9.8,-3.008 9.8,3.858 ; 10.52,3.858 10.52,-1.102 11.07,-1.102 11.07,3.858 ; 11.79,3.858 11.79,-3.008 12.34,-3.008 12.34,3.858 ; 13.025,-0.243 13.375,-0.243 15.375,-1.398 17.375,-0.243 17.725,-0.243 ; 13.025,2.148 13.375,2.148 15.375,3.303 17.375,2.148 17.725,2.148 ; -17.725,-3.643 -17.725,11.358 17.725,11.358 17.725,-3.643 -17.725,-3.643 ; -17.725,3.558 -13.025,3.558 -17.725,3.558 ; -15.625,-1.048 -15.125,-1.048 -15.125,2.953 -15.625,2.953 -15.625,-1.048 ; 13.025,3.558 17.725,3.558 13.025,3.558 ; 15.125,-1.048 15.625,-1.048 15.625,2.953 15.125,2.953 15.125,-1.048
  text "a1" at -14.787,-2.66 h1
  text "a20" at 13.588,-3.085 h1
  text "b1" at -12.647,4.742 h1
  text "b19" at 10.213,4.742 h1
3D body "HIROSE_FX2-40P-1.27DSL(71).stp": height 7.5, standoff -3.3, extent -17.725,-3.642 17.725,11.358

## HIROSE_FX2-80P-1.27DSL(71) [mm] "80 Contacts, 1.27mm Pitch, Right Angle Board to Board & Mezzanine Header with Prefixed Pin"
height 7.5
pads (82):
  round 1.5 hole 0.8: a1(-24.765,-0.953) a2(-23.495,-2.858) a3(-22.225,-0.953) a4(-20.955,-2.858) a5(-19.685,-0.953) a6(-18.415,-2.858) a7(-17.145,-0.953) a8(-15.875,-2.858) a9(-14.605,-0.953) a10(-13.335,-2.858) a11(-12.065,-0.953) a12(-10.795,-2.858) a13(-9.525,-0.953) a14(-8.255,-2.858) a15(-6.985,-0.953) a16(-5.715,-2.858) a17(-4.445,-0.953) a18(-3.175,-2.858) a19(-1.905,-0.953) a20(-0.635,-2.858) a21(0.635,-0.953) a22(1.905,-2.858) a23(3.175,-0.953) a24(4.445,-2.858) a25(5.715,-0.953) a26(6.985,-2.858) a27(8.255,-0.953) a28(9.525,-2.858) a29(10.795,-0.953) a30(12.065,-2.858) a31(13.335,-0.953) a32(14.605,-2.858) a33(15.875,-0.953) a34(17.145,-2.858) a35(18.415,-0.953) a36(19.685,-2.858) a37(20.955,-0.953) a38(22.225,-2.858) a39(23.495,-0.953) a40(24.765,-2.858) b1(-24.765,2.858) b2(-23.495,0.953) b3(-22.225,2.858) b4(-20.955,0.953) b5(-19.685,2.858) b6(-18.415,0.953) b7(-17.145,2.858) b8(-15.875,0.953) b9(-14.605,2.858) b10(-13.335,0.953) b11(-12.065,2.858) b12(-10.795,0.953) b13(-9.525,2.858) b14(-8.255,0.953) b15(-6.985,2.858) b16(-5.715,0.953) b17(-4.445,2.858) b18(-3.175,0.953) b19(-1.905,2.858) b20(-0.635,0.953) b21(0.635,2.858) b22(1.905,0.953) b23(3.175,2.858) b24(4.445,0.953) b25(5.715,2.858) b26(6.985,0.953) b27(8.255,2.858) b28(9.525,0.953) b29(10.795,2.858) b30(12.065,0.953) b31(13.335,2.858) b32(14.605,0.953) b33(15.875,2.858) b34(17.145,0.953) b35(18.415,2.858) b36(19.685,0.953) b37(20.955,2.858) b38(22.225,0.953) b39(23.495,2.858) b40(24.765,0.953)
  round 3 hole 2.3: MECH1(-28.075,0.953) MECH2(28.075,0.953)
Top Overlay:
  circle w0.3: c-24.8,-4.3 r0.15
  lines w0.2: -30.425,-0.243 -30.075,-0.243 -28.075,-1.398 -26.075,-0.243 -25.725,-0.243 ; -30.425,2.148 -30.075,2.148 -28.075,3.303 -26.075,2.148 -25.725,2.148 ; -25.725,-3.643 -25.725,-1.586 ; -25.725,-0.319 -25.725,2.224 ; -24.335,-3.643 -30.425,-3.643 -30.425,11.358 30.425,11.358 30.425,-3.643 25.605,-3.643 ; 24.644,3.858 25.725,3.858 25.725,1.586 ; 25.725,-3.643 25.725,-3.491 ; 25.725,-2.224 25.725,0.319 ; 25.725,-0.243 26.075,-0.243 28.075,-1.398 30.075,-0.243 30.425,-0.243 ; 25.725,2.148 26.075,2.148 28.075,3.303 30.075,2.148 30.425,2.148 ; -30.425,3.558 -25.725,3.558 -30.425,3.558 ; 25.725,3.558 30.425,3.558 25.725,3.558
  text "b1" at -25.347,4.742 h1
  text "b39" at 22.913,4.742 h1
  text "a1" at -27.487,-2.66 h1
  text "a40" at 26.288,-3.085 h1
Mechanical 8:
  drawing of 332 lines, arcs and shapes, not listed
Mechanical 14:
  drawing of 156 lines, arcs and shapes, not listed
  text "b1" at -25.347,4.742 h1
  text "b39" at 22.913,4.742 h1
  text "a1" at -27.487,-2.66 h1
  text "a40" at 26.288,-3.085 h1
3D body "HIROSE_FX2-80P-1.27DSL(71).stp": height 7.5, standoff -3.3, extent -30.425,-3.642 30.425,11.358